# Altium footprint library 3.22-杂项.PcbLib: 985 footprints (part 49 of 64)
Each footprint in its own frame and in the unit in brackets; x right, y up, seen from the top. Pads: shape width x height; smd on the part's side, far side on the other; paste and mask are expansions set on the pad; w line width, h text height; cw(c..) or ccw(c..) is an arc to the next point about the centre after c.
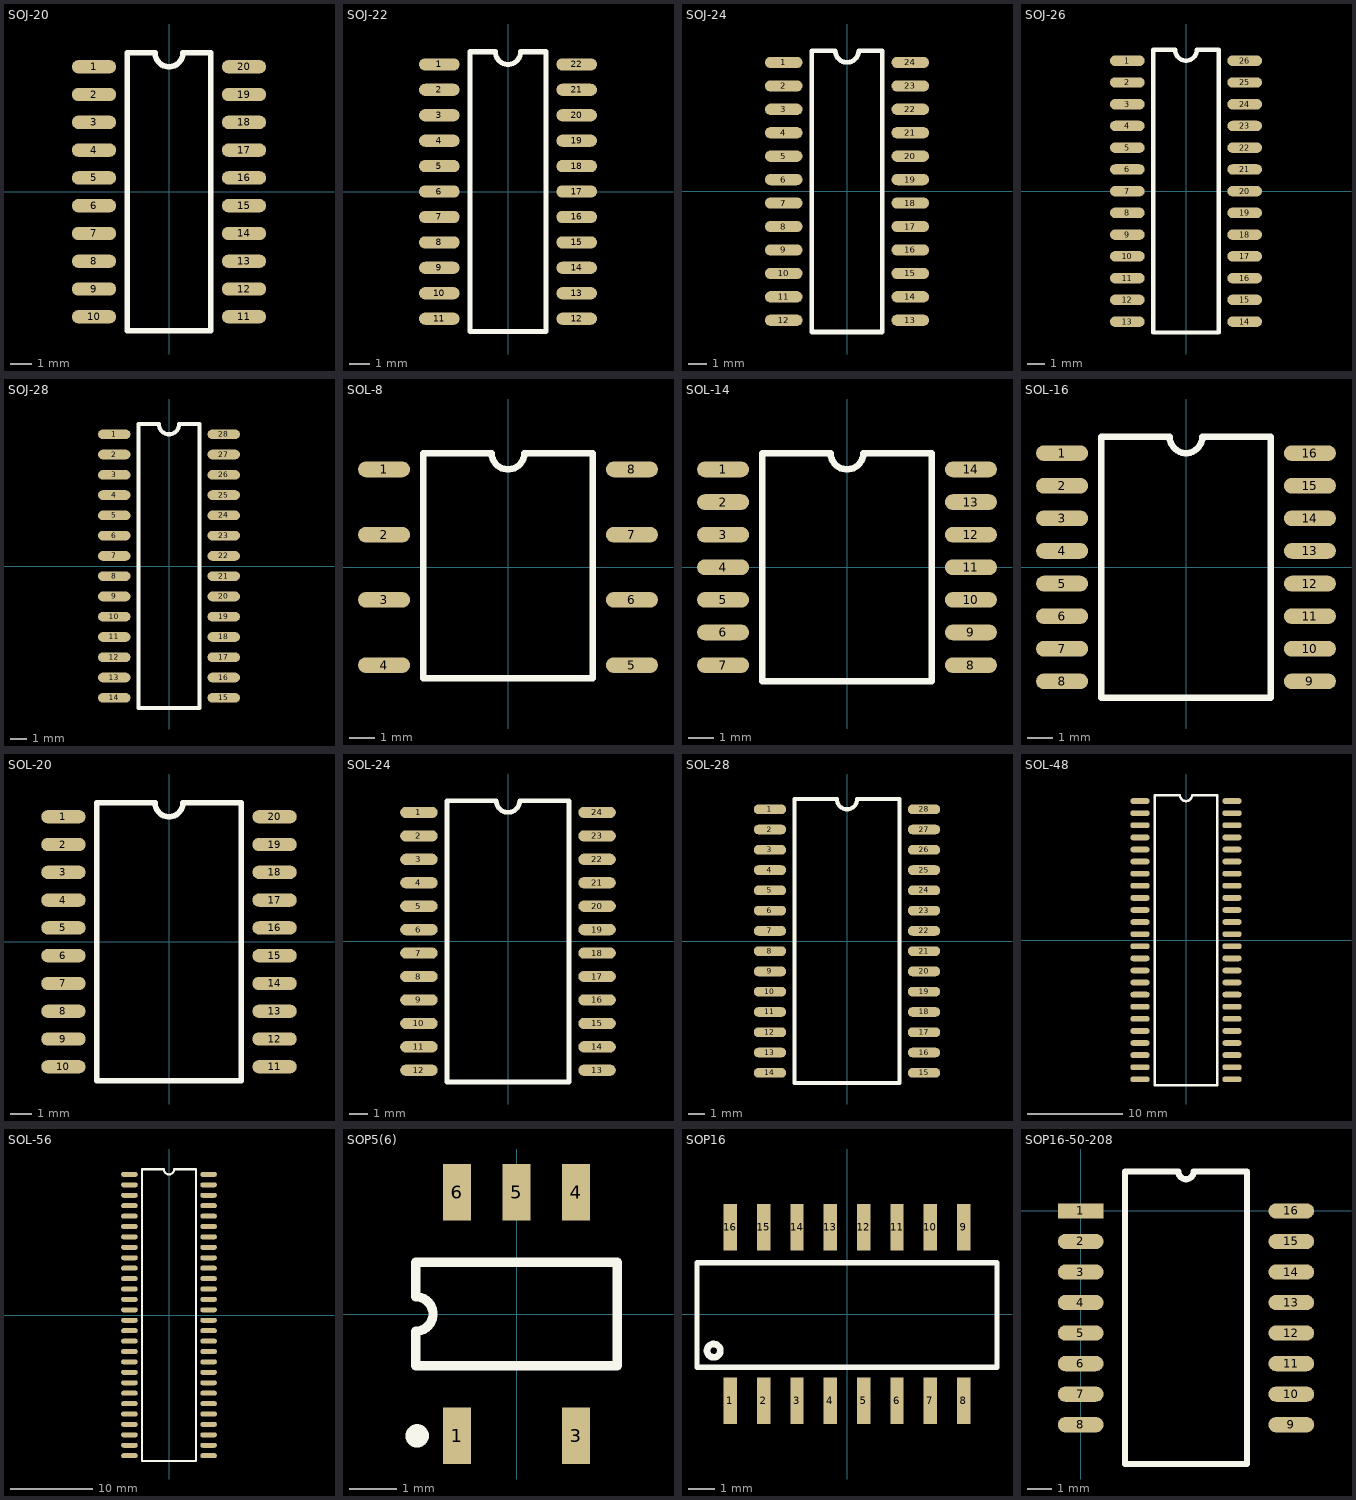
[diagram p48: the footprints below, top view; thin cyan lines are the x and y axes]

## SOJ-20 [mil]
pads (20):
  oval 80x24 smd: 1(-135,225) 2(-135,175) 3(-135,125) 4(-135,75) 5(-135,25) 6(-135,-25) 7(-135,-75) 8(-135,-125) 9(-135,-175) 10(-135,-225) 11(135,-225) 12(135,-175) 13(135,-125) 14(135,-75) 15(135,-25) 16(135,25) 17(135,75) 18(135,125) 19(135,175) 20(135,225)
Top Overlay:
  lines w10: -75,-250 -75,250 -25,250 ccw(c0,250) 25,250 75,250 75,-250 -75,-250

## SOJ-22 [mil]
pads (22):
  oval 80x24 smd: 1(-135,250) 2(-135,200) 3(-135,150) 4(-135,100) 5(-135,50) 6(-135,0) 7(-135,-50) 8(-135,-100) 9(-135,-150) 10(-135,-200) 11(-135,-250) 12(135,-250) 13(135,-200) 14(135,-150) 15(135,-100) 16(135,-50) 17(135,0) 18(135,50) 19(135,100) 20(135,150) 21(135,200) 22(135,250)
Top Overlay:
  lines w10: -75,-275 -75,275 -25,275 ccw(c0,275) 25,275 75,275 75,-275 -75,-275

## SOJ-24 [mil]
pads (24):
  oval 80x24 smd: 1(-135,275) 2(-135,225) 3(-135,175) 4(-135,125) 5(-135,75) 6(-135,25) 7(-135,-25) 8(-135,-75) 9(-135,-125) 10(-135,-175) 11(-135,-225) 12(-135,-275) 13(135,-275) 14(135,-225) 15(135,-175) 16(135,-125) 17(135,-75) 18(135,-25) 19(135,25) 20(135,75) 21(135,125) 22(135,175) 23(135,225) 24(135,275)
Top Overlay:
  lines w10: -75,-300 75,-300 75,300 25,300 cw(c0,300) -25,300 -75,300 -75,-300

## SOJ-26 [mil]
pads (26):
  oval 80x24 smd: 1(-135,300) 2(-135,250) 3(-135,200) 4(-135,150) 5(-135,100) 6(-135,50) 7(-135,0) 8(-135,-50) 9(-135,-100) 10(-135,-150) 11(-135,-200) 12(-135,-250) 13(-135,-300) 14(135,-300) 15(135,-250) 16(135,-200) 17(135,-150) 18(135,-100) 19(135,-50) 20(135,0) 21(135,50) 22(135,100) 23(135,150) 24(135,200) 25(135,250) 26(135,300)
Top Overlay:
  lines w10: -75,-325 -75,325 -25,325 ccw(c0,325) 25,325 75,325 75,-325 -75,-325

## SOJ-28 [mil]
pads (28):
  oval 80x24 smd: 1(-135,325) 2(-135,275) 3(-135,225) 4(-135,175) 5(-135,125) 6(-135,75) 7(-135,25) 8(-135,-25) 9(-135,-75) 10(-135,-125) 11(-135,-175) 12(-135,-225) 13(-135,-275) 14(-135,-325) 15(135,-325) 16(135,-275) 17(135,-225) 18(135,-175) 19(135,-125) 20(135,-75) 21(135,-25) 22(135,25) 23(135,75) 24(135,125) 25(135,175) 26(135,225) 27(135,275) 28(135,325)
Top Overlay:
  lines w10: -75,-350 -75,350 -25,350 ccw(c0,350) 25,350 75,350 75,-350 -75,-350

## SOL-8 [mil] "R-PDSO-G8(DUB:ISO1050)"
pads (8):
  oval 80x24 smd: 1(-190,150) 2(-190,50) 3(-190,-50) 4(-190,-150) 5(190,-150) 6(190,-50) 7(190,50) 8(190,150)
Top Overlay:
  lines w10: -130,-170 130,-170 130,175 25,175 cw(c0,175) -25,175 -130,175 -130,-170

## SOL-14 [mil]
pads (14):
  oval 80x24 smd: 1(-190,150) 2(-190,100) 3(-190,50) 4(-190,0) 5(-190,-50) 6(-190,-100) 7(-190,-150) 8(190,-150) 9(190,-100) 10(190,-50) 11(190,0) 12(190,50) 13(190,100) 14(190,150)
Top Overlay:
  lines w10: -130,-175 -130,175 -25,175 ccw(c0,175) 25,175 130,175 130,-175 -130,-175

## SOL-16 [mil] "R-PDSO-G16(DW:ISO1050)"
pads (16):
  oval 80x24 smd: 1(-190,175) 2(-190,125) 3(-190,75) 4(-190,25) 5(-190,-25) 6(-190,-75) 7(-190,-125) 8(-190,-175) 9(190,-175) 10(190,-125) 11(190,-75) 12(190,-25) 13(190,25) 14(190,75) 15(190,125) 16(190,175)
Top Overlay:
  lines w10: -130,-200 130,-200 130,200 25,200 cw(c0,200) -25,200 -130,200 -130,-200

## SOL-20 [mil]
pads (20):
  oval 80x24 smd: 1(-190,225) 2(-190,175) 3(-190,125) 4(-190,75) 5(-190,25) 6(-190,-25) 7(-190,-75) 8(-190,-125) 9(-190,-175) 10(-190,-225) 11(190,-225) 12(190,-175) 13(190,-125) 14(190,-75) 15(190,-25) 16(190,25) 17(190,75) 18(190,125) 19(190,175) 20(190,225)
Top Overlay:
  lines w10: -130,-250 130,-250 130,250 25,250 cw(c0,250) -25,250 -130,250 -130,-250

## SOL-24 [mil]
pads (24):
  oval 80x24 smd: 1(-190,275) 2(-190,225) 3(-190,175) 4(-190,125) 5(-190,75) 6(-190,25) 7(-190,-25) 8(-190,-75) 9(-190,-125) 10(-190,-175) 11(-190,-225) 12(-190,-275) 13(190,-275) 14(190,-225) 15(190,-175) 16(190,-125) 17(190,-75) 18(190,-25) 19(190,25) 20(190,75) 21(190,125) 22(190,175) 23(190,225) 24(190,275)
Top Overlay:
  lines w10: -130,-300 -130,300 -25,300 ccw(c0,300) 25,300 130,300 130,-300 -130,-300

## SOL-28 [mil]
pads (28):
  oval 80x24 smd: 1(-190,325) 2(-190,275) 3(-190,225) 4(-190,175) 5(-190,125) 6(-190,75) 7(-190,25) 8(-190,-25) 9(-190,-75) 10(-190,-125) 11(-190,-175) 12(-190,-225) 13(-190,-275) 14(-190,-325) 15(190,-325) 16(190,-275) 17(190,-225) 18(190,-175) 19(190,-125) 20(190,-75) 21(190,-25) 22(190,25) 23(190,75) 24(190,125) 25(190,175) 26(190,225) 27(190,275) 28(190,325)
Top Overlay:
  lines w10: -130,-350 130,-350 130,350 25,350 cw(c0,350) -25,350 -130,350 -130,-350

## SOL-48 [mil]
pads (48):
  oval 80x24 smd: 1(-190,575) 2(-190,525) 3(-190,475) 4(-190,425) 5(-190,375) 6(-190,325) 7(-190,275) 8(-190,225) 9(-190,175) 10(-190,125) 11(-190,75) 12(-190,25) 13(-190,-25) 14(-190,-75) 15(-190,-125) 16(-190,-175) 17(-190,-225) 18(-190,-275) 19(-190,-325) 20(-190,-375) 21(-190,-425) 22(-190,-475) 23(-190,-525) 24(-190,-575) 25(190,-575) 26(190,-525) 27(190,-475) 28(190,-425) 29(190,-375) 30(190,-325) 31(190,-275) 32(190,-225) 33(190,-175) 34(190,-125) 35(190,-75) 36(190,-25) 37(190,25) 38(190,75) 39(190,125) 40(190,175) 41(190,225) 42(190,275) 43(190,325) 44(190,375) 45(190,425) 46(190,475) 47(190,525) 48(190,575)
Top Overlay:
  lines w10: -130,-600 -130,600 -25,600 ccw(c0,600) 25,600 130,600 130,-600 -130,-600

## SOL-56 [mil]
pads (56):
  oval 80x24 smd: 1(-190,675) 2(-190,625) 3(-190,575) 4(-190,525) 5(-190,475) 6(-190,425) 7(-190,375) 8(-190,325) 9(-190,275) 10(-190,225) 11(-190,175) 12(-190,125) 13(-190,75) 14(-190,25) 15(-190,-25) 16(-190,-75) 17(-190,-125) 18(-190,-175) 19(-190,-225) 20(-190,-275) 21(-190,-325) 22(-190,-375) 23(-190,-425) 24(-190,-475) 25(-190,-525) 26(-190,-575) 27(-190,-625) 28(-190,-675) 29(190,-675) 30(190,-625) 31(190,-575) 32(190,-525) 33(190,-475) 34(190,-425) 35(190,-375) 36(190,-325) 37(190,-275) 38(190,-225) 39(190,-175) 40(190,-125) 41(190,-75) 42(190,-25) 43(190,25) 44(190,75) 45(190,125) 46(190,175) 47(190,225) 48(190,275) 49(190,325) 50(190,375) 51(190,425) 52(190,475) 53(190,525) 54(190,575) 55(190,625) 56(190,675)
Top Overlay:
  lines w10: -130,-700 -130,700 -25,700 ccw(c0,700) 25,700 130,700 130,-700 -130,-700

## SOP5(6) [mm] "Small Outline; 6 Leads (1 Absent); Body Width 4.4 mm; Pitch 1.27 mm"
height 2.4
pads (5):
  rect 0.6x1.2 smd: 1(-1.27,-2.6) 3(1.27,-2.6) 4(1.27,2.6) 5(0,2.6) 6(-1.27,2.6)
Top Overlay:
  circle w0.25: c-2.12,-2.6 r0.125
  lines w0.2: -2.15,-1.1 2.15,-1.1 2.15,1.1 -2.15,1.1 -2.15,0.367 cw(c-2.15,0) -2.15,-0.367 -2.15,-1.1

## SOP16 [mil]
pads (16):
  rect 20x70 smd: 1(-175,-130) 2(-125,-130) 3(-75,-130) 4(-25,-130) 5(25,-130) 6(75,-130) 7(125,-130) 8(175,-130) 9(175,130) 10(125,130) 11(75,130) 12(25,130) 13(-25,130) 14(-75,130) 15(-125,130) 16(-175,130)
Top Overlay:
  circle w10: c-200,-55 r10
  lines w8: -225,-80 225,-80 225,77 -225,77 -225,-80

## SOP16-50-208 [mil]
height 196.85
pads (16):
  rect 75x25 smd: 1(0,0)
  oval 75x25 smd: 2(0,-50) 3(0,-100) 4(0,-150) 5(0,-200) 6(0,-250) 7(0,-300) 8(0,-350) 9(345,-350) 10(345,-300) 11(345,-250) 12(345,-200) 13(345,-150) 14(345,-100) 15(345,-50) 16(345,0)
Top Overlay:
  lines w10: 72.5,-414.37 272.5,-414.37 272.5,64.37 185,64.37 cw(c172.5,64.37) 160,64.37 72.5,64.37 72.5,-414.37